# Altium integrated library ALTIUM-WE-LAN-rev17a.IntLib: 34 symbols
Pins are listed as number, name and electrical type; pins without a type are passive.

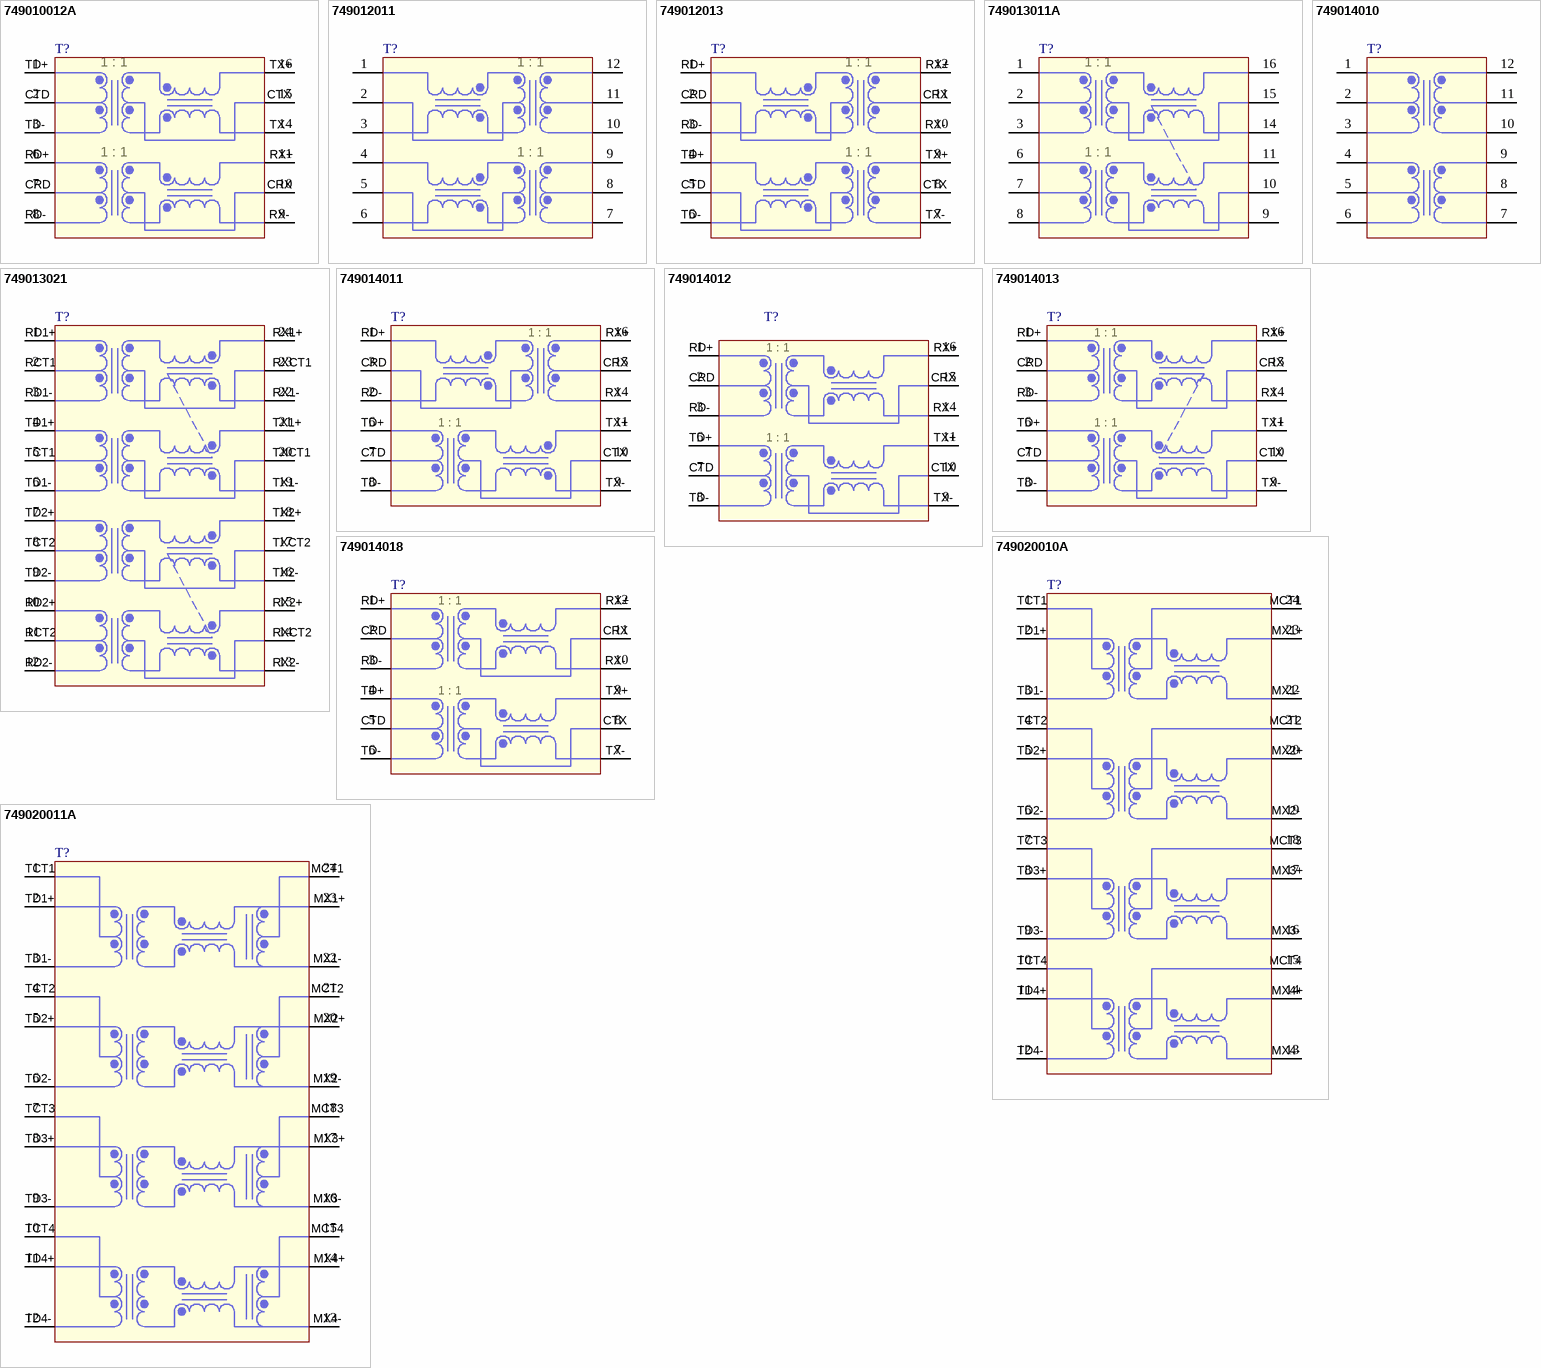
[diagram p0: symbols 749010012A to 749020011A]

## 749010012A
designator T?
WE-LAN LAN Transformer, 10/100 Base-T; PartNumber: 749010012A; PoE: non-PoE; PublishedDate: Dec. 2016; Publisher: Wurth Elektronik; ComponentLink1Description: Manufacturer; ComponentLink1URL: http://www.we-online.de; ComponentLink2Description: Datasheet; ComponentLink2URL: http://katalog.we-online.de/pbs/datasheet/749010012A.pdf; DataRate: 10/100 Base-T
footprint 749010012A (SMD LAN Transformers, body 12.7x8.8mm, 16-Leads)
pins: 1 TD+, 2 CTD, 3 TD-, 6 RD+, 7 CRD, 8 RD-, 9 RX-, 10 CRX, 11 RX+, 14 TX-, 15 CTX, 16 TX+
text: 1 : 1

## 749012011
designator T?
WE-LAN LAN Transformer, 10/100 Base-T; PartNumber: 749012011; PoE: PoE+ (over 350 mA); PublishedDate: Dec. 2016; Publisher: Wurth Elektronik; ComponentLink1Description: Manufacturer; ComponentLink1URL: http://www.we-online.de; ComponentLink2Description: Datasheet; ComponentLink2URL: http://katalog.we-online.de/pbs/datasheet/749012011.pdf; DataRate: 10/100 Base-T
footprint 749012011 (SMD LAN Transformers, body 17.1x14.75mm, 12-Leads)
pins: 1, 2, 3, 4, 5, 6, 7, 8, 9, 10, 11, 12
text: 1 : 1

## 749012013
designator T?
WE-LAN LAN Transformer, 10/100 Base-T; PartNumber: 749012013; PoE: PoE+ (over 350 mA); PublishedDate: Dec. 2016; Publisher: Wurth Elektronik; ComponentLink1Description: Manufacturer; ComponentLink1URL: http://www.we-online.de; ComponentLink2Description: Datasheet; ComponentLink2URL: http://katalog.we-online.de/pbs/datasheet/749012013.pdf; DataRate: 10/100 Base-T
footprint 749012013
pins: 1 RD+, 2 CRD, 3 RD-, 4 TD+, 5 CTD, 6 TD-, 7 TX-, 8 CTX, 9 TX+, 10 RX-, 11 CRX, 12 RX+
text: 1 : 1

## 749013011A
designator T?
WE-LAN LAN Transformer, 10/100 Base-T; PartNumber: 749013011A; PoE: PoE (up to 350 mA); PublishedDate: Dec. 2016; Publisher: Wurth Elektronik; ComponentLink1Description: Manufacturer; ComponentLink1URL: http://www.we-online.de; ComponentLink2Description: Datasheet; ComponentLink2URL: http://katalog.we-online.de/pbs/datasheet/749013011A.pdf; DataRate: 10/100 Base-T
footprint 749013011A
pins: 1, 2, 3, 6, 7, 8, 9, 10, 11, 14, 15, 16
text: 1 : 1

## 749013021
designator T?
WE-LAN LAN Transformer, 10/100 Base-T; PartNumber: 749013021; PoE: PoE (up to 350 mA); PublishedDate: Dec. 2016; Publisher: Wurth Elektronik; ComponentLink1Description: Manufacturer; ComponentLink1URL: http://www.we-online.de; ComponentLink2Description: Datasheet; ComponentLink2URL: http://katalog.we-online.de/pbs/datasheet/749013021.pdf; DataRate: 10/100 Base-T
footprint 749013021
pins: 1 RD1+, 2 RCT1, 3 RD1-, 4 TD1+, 5 TCT1, 6 TD1-, 7 TD2+, 8 TCT2, 9 TD2-, 10 RD2+, 11 RCT2, 12 RD2-, 13 RX2-, 14 RXCT2, 15 RX2+, 16 TX2-, 17 TXCT2, 18 TX2+, 19 TX1-, 20 TXCT1, 21 TX1+, 22 RX1-, 23 RXCT1, 24 RX1+

## 749014010
designator T?
WE-LAN LAN Transformer, 10/100 Base-T; PartNumber: 749014010; PoE: non-PoE; PublishedDate: Dec. 2016; Publisher: Wurth Elektronik; ComponentLink1Description: Manufacturer; ComponentLink1URL: http://www.we-online.de; ComponentLink2Description: Datasheet; ComponentLink2URL: http://katalog.we-online.de/pbs/datasheet/749014010.pdf; DataRate: 10/100 Base-T
footprint 749014010
pins: 1, 2, 3, 4, 5, 6, 7, 8, 9, 10, 11, 12

## 749014011
designator T?
WE-LAN LAN Transformer, 10/100 Base-T; PartNumber: 749014011; PoE: non-PoE; PublishedDate: Dec. 2016; Publisher: Wurth Elektronik; ComponentLink1Description: Manufacturer; ComponentLink1URL: http://www.we-online.de; ComponentLink2Description: Datasheet; ComponentLink2URL: http://katalog.we-online.de/pbs/datasheet/749014011.pdf; DataRate: 10/100 Base-T
footprint 749014011
pins: 1 RD+, 2 RD-, 3 CRD, 6 TD+, 7 CTD, 8 TD-, 9 TX-, 10 CTX, 11 TX+, 14 RX-, 15 CRX, 16 RX+
text: 1 : 1

## 749014012
designator T?
WE-LAN LAN Transformer, 10/100 Base-T; PartNumber: 749014012; PoE: non-PoE; PublishedDate: Dec. 2016; Publisher: Wurth Elektronik; ComponentLink1Description: Manufacturer; ComponentLink1URL: http://www.we-online.de; ComponentLink2Description: Datasheet; ComponentLink2URL: http://katalog.we-online.de/pbs/datasheet/749014012.pdf; DataRate: 10/100 Base-T
footprint 749014012
pins: 1 RD+, 2 CRD, 3 RD-, 6 TD+, 7 CTD, 8 TD-, 9 TX-, 10 CTX, 11 TX+, 14 RX-, 15 CRX, 16 RX+
text: 1 : 1

## 749014013
designator T?
WE-LAN LAN Transformer, 10/100 Base-T; PartNumber: 749014013; PoE: PoE (up to 350 mA); PublishedDate: Dec. 2016; Publisher: Wurth Elektronik; ComponentLink1Description: Manufacturer; ComponentLink1URL: http://www.we-online.de; ComponentLink2Description: Datasheet; ComponentLink2URL: http://katalog.we-online.de/pbs/datasheet/749014013.pdf; DataRate: 10/100 Base-T
footprint 749014013
pins: 1 RD+, 2 CRD, 3 RD-, 6 TD+, 7 CTD, 8 TD-, 9 TX-, 10 CTX, 11 TX+, 14 RX-, 15 CRX, 16 RX+
text: 1 : 1

## 749014018
designator T?
WE-LAN LAN Transformer, 10/100/1000 Base-T; PartNumber: 749014018; PoE: non-PoE; PublishedDate: Dec. 2016; Publisher: Wurth Elektronik; ComponentLink1Description: Manufacturer; ComponentLink1URL: http://www.we-online.de; ComponentLink2Description: Datasheet; ComponentLink2URL: http://katalog.we-online.de/pbs/datasheet/749014018.pdf; DataRate: 10/100/1000 Base-T
footprint 749014018
pins: 1 RD+, 2 CRD, 3 RD-, 4 TD+, 5 CTD, 6 TD-, 7 TX-, 8 CTX, 9 TX+, 10 RX-, 11 CRX, 12 RX+
text: 1 : 1

## 749020010A
designator T?
WE-LAN LAN Transformer, 10/100/1000 Base-T; PartNumber: 749020010A; PoE: non-PoE; PublishedDate: Dec. 2016; Publisher: Wurth Elektronik; ComponentLink1Description: Manufacturer; ComponentLink1URL: http://www.we-online.de; ComponentLink2Description: Datasheet; ComponentLink2URL: http://katalog.we-online.de/pbs/datasheet/749020010A.pdf; DataRate: 10/100/1000 Base-T
footprint 749020010A
pins: 1 TCT1, 2 TD1+, 3 TD1-, 4 TCT2, 5 TD2+, 6 TD2-, 7 TCT3, 8 TD3+, 9 TD3-, 10 TCT4, 11 TD4+, 12 TD4-, 13 MX4-, 14 MX4+, 15 MCT4, 16 MX3-, 17 MX3+, 18 MCT3, 19 MX2-, 20 MX2+, 21 MCT2, 22 MX1-, 23 MX1+, 24 MCT1

## 749020011A
designator T?
WE-LAN LAN Transformer, 10/100/1000 Base-T; PartNumber: 749020011A; PoE: non-PoE; PublishedDate: Dec. 2016; Publisher: Wurth Elektronik; ComponentLink1Description: Manufacturer; ComponentLink1URL: http://www.we-online.de; ComponentLink2Description: Datasheet; ComponentLink2URL: http://katalog.we-online.de/pbs/datasheet/749020011A.pdf; DataRate: 10/100/1000 Base-T
footprint 749020011A
pins: 1 TCT1, 2 TD1+, 3 TD1-, 4 TCT2, 5 TD2+, 6 TD2-, 7 TCT3, 8 TD3+, 9 TD3-, 10 TCT4, 11 TD4+, 12 TD4-, 13 MX4-, 14 MX4+, 15 MCT4, 16 MX3-, 17 MX3+, 18 MCT3, 19 MX2-, 20 MX2+, 21 MCT2, 22 MX1-, 23 MX1+, 24 MCT1

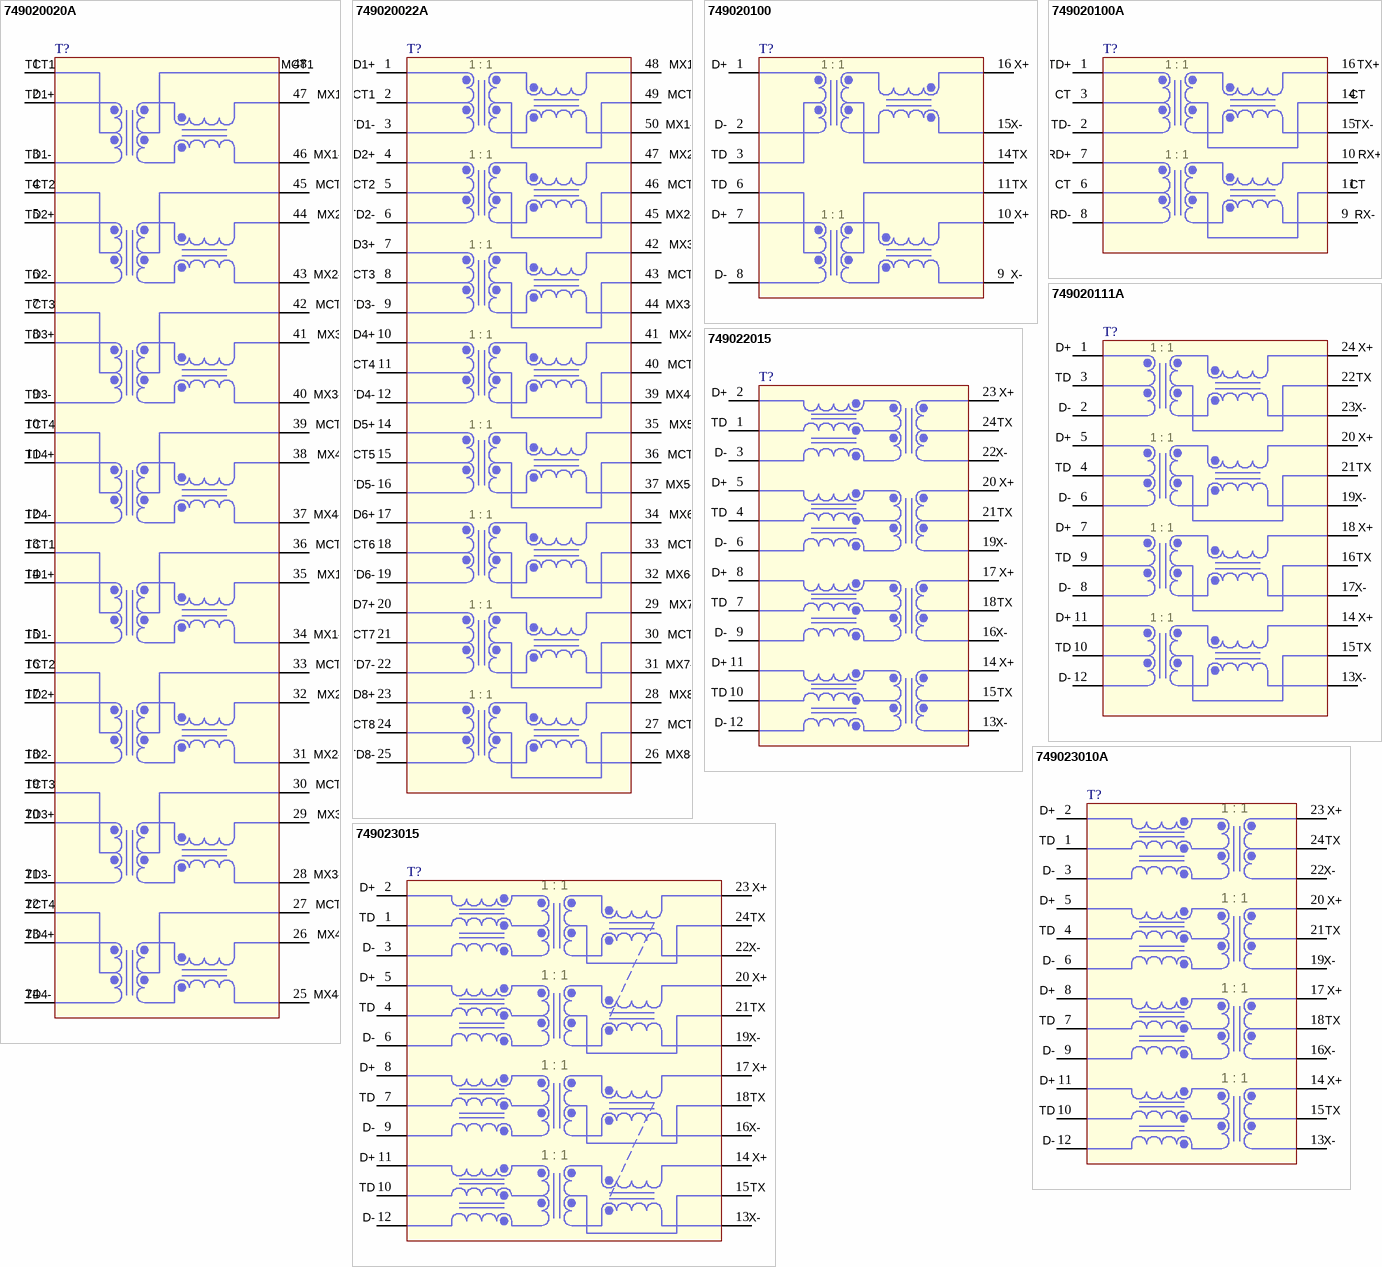
[diagram p1: symbols 749020020A to 749023015]

## 749020020A
designator T?
WE-LAN LAN Transformer, 10/100/1000 Base-T; PartNumber: 749020020A; PoE: non-PoE; PublishedDate: Dec. 2016; Publisher: Wurth Elektronik; ComponentLink1Description: Manufacturer; ComponentLink1URL: http://www.we-online.de; ComponentLink2Description: Datasheet; ComponentLink2URL: http://katalog.we-online.de/pbs/datasheet/749020020A.pdf; DataRate: 10/100/1000 Base-T
footprint 749020020A
pins: 1 TCT1, 2 TD1+, 3 TD1-, 4 TCT2, 5 TD2+, 6 TD2-, 7 TCT3, 8 TD3+, 9 TD3-, 10 TCT4, 11 TD4+, 12 TD4-, 13 TCT1, 14 TD1+, 15 TD1-, 16 TCT2, 17 TD2+, 18 TD2-, 19 TCT3, 20 TD3+, 21 TD3-, 22 TCT4, 23 TD4+, 24 TD4-, 25 MX4-, 26 MX4+, 27 MCT4, 28 MX3-, 29 MX3+, 30 MCT3, 31 MX2-, 32 MX2+, 33 MCT2, 34 MX1-, 35 MX1+, 36 MCT1, 37 MX4-, 38 MX4+, 39 MCT4, 40 MX3-, 41 MX3+, 42 MCT3, 43 MX2-, 44 MX2+, 45 MCT2, 46 MX1-, 47 MX1+, 48 MCT1

## 749020022A
designator T?
WE-LAN LAN Transformer, 10/100/1000 Base-T; PartNumber: 749020022A; PoE: non-PoE; PublishedDate: Dec. 2016; Publisher: Wurth Elektronik; ComponentLink1Description: Manufacturer; ComponentLink1URL: http://www.we-online.de; ComponentLink2Description: Datasheet; ComponentLink2URL: http://katalog.we-online.de/pbs/datasheet/749020022A.pdf; DataRate: 10/100/1000 Base-T
footprint 749020022A
pins: 1 TD1+, 2 TCT1, 3 TD1-, 4 TD2+, 5 TCT2, 6 TD2-, 7 TD3+, 8 TCT3, 9 TD3-, 10 TD4+, 11 TCT4, 12 TD4-, 14 TD5+, 15 TCT5, 16 TD5-, 17 TD6+, 18 TCT6, 19 TD6-, 20 TD7+, 21 TCT7, 22 TD7-, 23 TD8+, 24 TCT8, 25 TD8-, 26 MX8-, 27 MCT8, 28 MX8+, 29 MX7+, 30 MCT7, 31 MX7-, 32 MX6-, 33 MCT6, 34 MX6+, 35 MX5+, 36 MCT5, 37 MX5-, 39 MX4-, 40 MCT4, 41 MX4+, 42 MX3+, 43 MCT3, 44 MX3-, 45 MX2-, 46 MCT2, 47 MX2+, 48 MX1+, 49 MCT1, 50 MX1-
text: 1 : 1

## 749020100
designator T?
WE-LAN LAN Transformer, 10/100/1000 Base-T; PartNumber: 749020100; PoE: non-PoE; PublishedDate: Dec. 2016; Publisher: Wurth Elektronik; ComponentLink1Description: Manufacturer; ComponentLink1URL: http://www.we-online.de; ComponentLink2Description: Datasheet; ComponentLink2URL: http://katalog.we-online.de/pbs/datasheet/749020100.pdf; DataRate: 10/100/1000 Base-T
footprint 749020100
pins: 1 D+, 2 D-, 3 TD, 6 TD, 7 D+, 8 D-, 9 X-, 10 X+, 11 TX, 14 TX, 15 X-, 16 X+
text: 1 : 1

## 749020100A
designator T?
WE-LAN LAN Transformer, 10/100 Base-T; PartNumber: 749020100A; PoE: non-PoE; PublishedDate: Dec. 2016; Publisher: Wurth Elektronik; ComponentLink1Description: Manufacturer; ComponentLink1URL: http://www.we-online.de; ComponentLink2Description: Datasheet; ComponentLink2URL: http://katalog.we-online.de/pbs/datasheet/749020100A.pdf; DataRate: 10/100 Base-T
footprint 749020100A
pins: 1 TD+, 2 TD-, 3 CT, 6 CT, 7 RD+, 8 RD-, 9 RX-, 10 RX+, 11 CT, 14 CT, 15 TX-, 16 TX+
text: 1 : 1

## 749020111A
designator T?
WE-LAN LAN Transformer, 10/100/1000 Base-T; PartNumber: 749020111A; PoE: non-PoE; PublishedDate: Dec. 2016; Publisher: Wurth Elektronik; ComponentLink1Description: Manufacturer; ComponentLink1URL: http://www.we-online.de; ComponentLink2Description: Datasheet; ComponentLink2URL: http://katalog.we-online.de/pbs/datasheet/749020111A.pdf; DataRate: 10/100/1000 Base-T
footprint 749020111A
pins: 1 D+, 2 D-, 3 TD, 4 TD, 5 D+, 6 D-, 7 D+, 8 D-, 9 TD, 10 TD, 11 D+, 12 D-, 13 X-, 14 X+, 15 TX, 16 TX, 17 X-, 18 X+, 19 X-, 20 X+, 21 TX, 22 TX, 23 X-, 24 X+
text: 1 : 1

## 749022015
designator T?
WE-LAN LAN Transformer, 10/100/1000 Base-T; PartNumber: 749022015; PoE: PoE+ (over 350 mA); PublishedDate: Dec. 2016; Publisher: Wurth Elektronik; ComponentLink1Description: Manufacturer; ComponentLink1URL: http://www.we-online.de; ComponentLink2Description: Datasheet; ComponentLink2URL: http://katalog.we-online.de/pbs/datasheet/749022015.pdf; DataRate: 10/100/1000 Base-T
footprint 749022015
pins: 1 TD, 2 D+, 3 D-, 4 TD, 5 D+, 6 D-, 7 TD, 8 D+, 9 D-, 10 TD, 11 D+, 12 D-, 13 X-, 14 X+, 15 TX, 16 X-, 17 X+, 18 TX, 19 X-, 20 X+, 21 TX, 22 X-, 23 X+, 24 TX

## 749023010A
designator T?
WE-LAN LAN Transformer, 10/100/1000 Base-T; PartNumber: 749023010A; PoE: PoE (up to 350 mA); PublishedDate: Dec. 2016; Publisher: Wurth Elektronik; ComponentLink1Description: Manufacturer; ComponentLink1URL: http://www.we-online.de; ComponentLink2Description: Datasheet; ComponentLink2URL: http://katalog.we-online.de/pbs/datasheet/749023010A.pdf; DataRate: 10/100/1000 Base-T
footprint 749023010A
pins: 1 TD, 2 D+, 3 D-, 4 TD, 5 D+, 6 D-, 7 TD, 8 D+, 9 D-, 10 TD, 11 D+, 12 D-, 13 X-, 14 X+, 15 TX, 16 X-, 17 X+, 18 TX, 19 X-, 20 X+, 21 TX, 22 X-, 23 X+, 24 TX
text: 1 : 1

## 749023015
designator T?
WE-LAN LAN Transformer, 10/100/1000 Base-T; PartNumber: 749023015; PoE: PoE (up to 350 mA); PublishedDate: Dec. 2016; Publisher: Wurth Elektronik; ComponentLink1Description: Manufacturer; ComponentLink1URL: http://www.we-online.de; ComponentLink2Description: Datasheet; ComponentLink2URL: http://katalog.we-online.de/pbs/datasheet/749023015.pdf; DataRate: 10/100/1000 Base-T
footprint 749023015
pins: 1 TD, 2 D+, 3 D-, 4 TD, 5 D+, 6 D-, 7 TD, 8 D+, 9 D-, 10 TD, 11 D+, 12 D-, 13 X-, 14 X+, 15 TX, 16 X-, 17 X+, 18 TX, 19 X-, 20 X+, 21 TX, 22 X-, 23 X+, 24 TX
text: 1 : 1

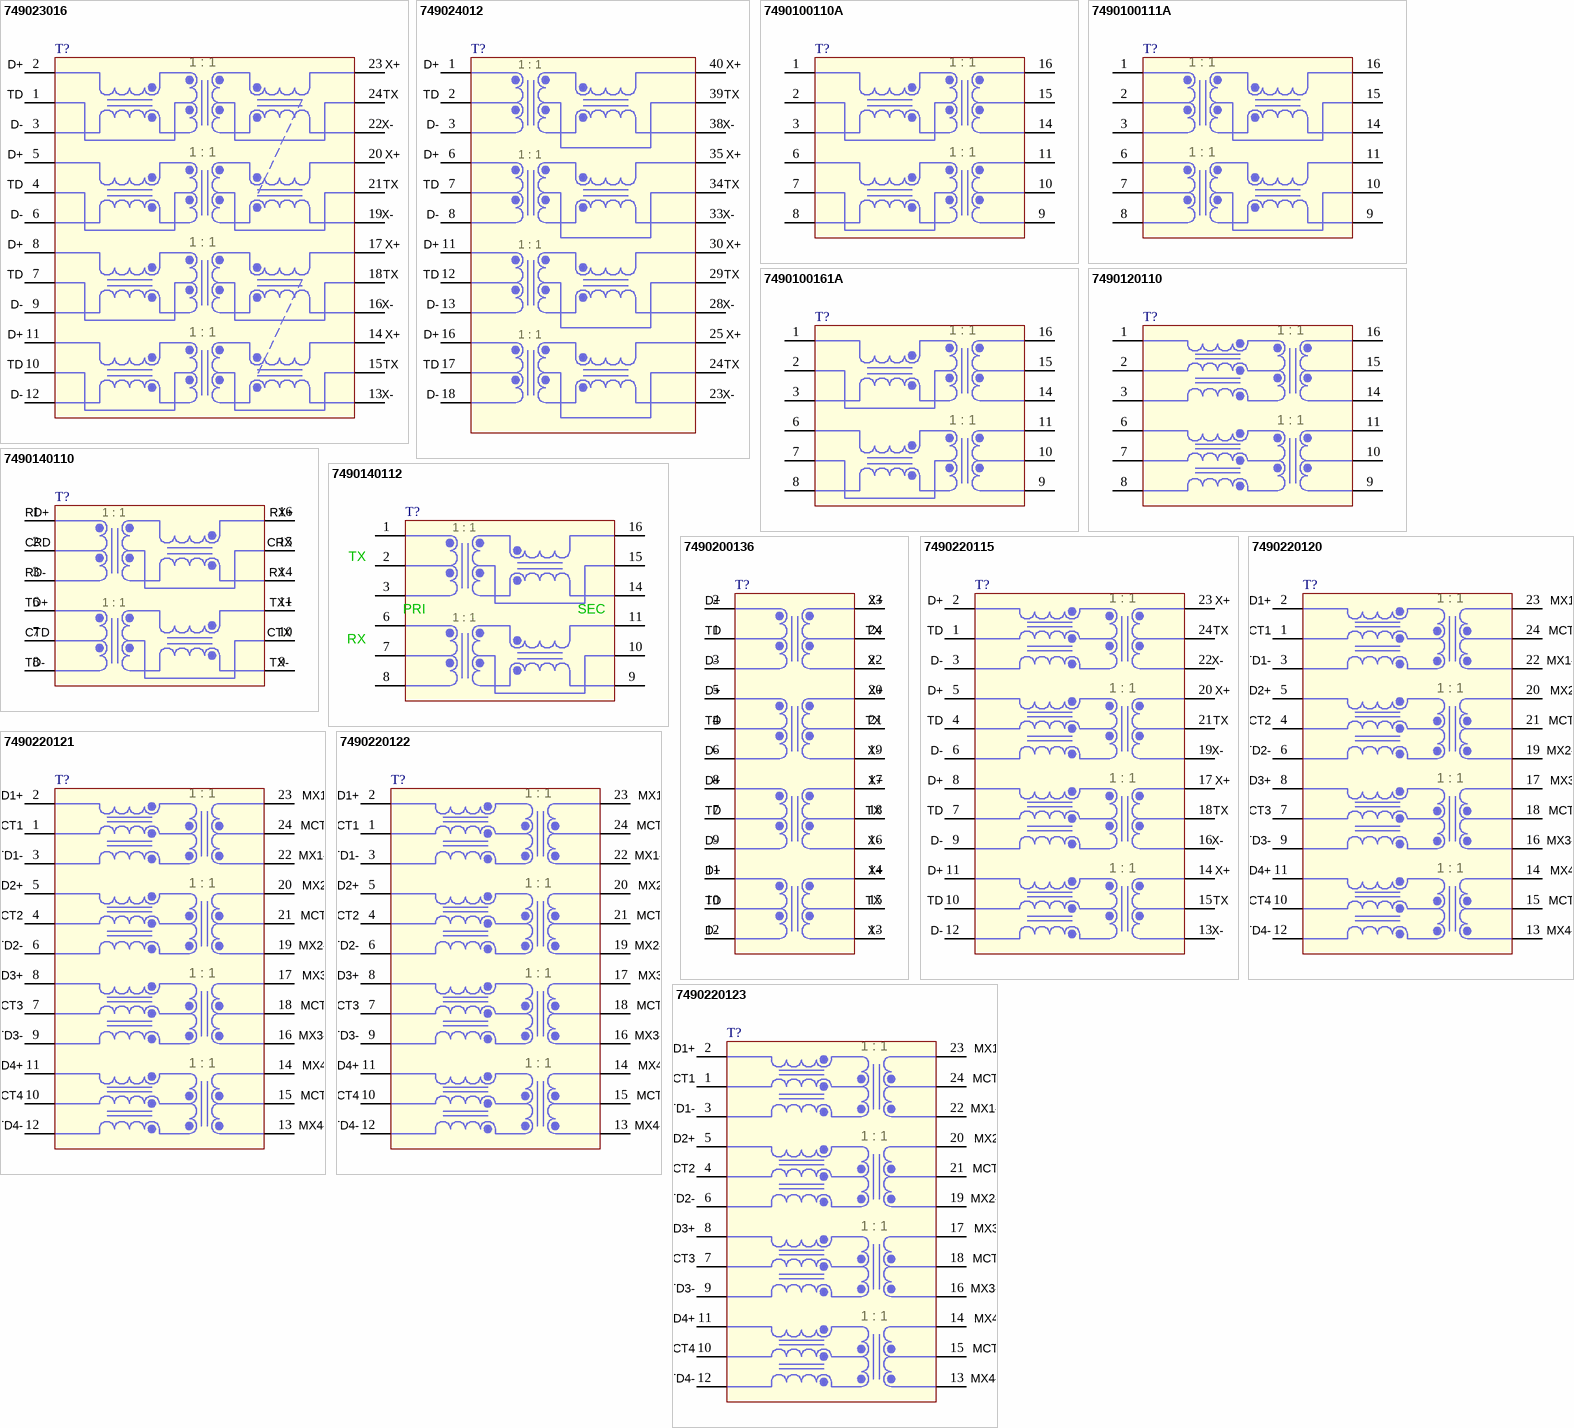
[diagram p2: symbols 749023016 to 7490220123]

## 749023016
designator T?
WE-LAN LAN Transformer, 10/100/1000 Base-T; PartNumber: 749023016; PoE: PoE (up to 350 mA); PublishedDate: Dec. 2016; Publisher: Wurth Elektronik; ComponentLink1Description: Manufacturer; ComponentLink1URL: http://www.we-online.de; ComponentLink2Description: Datasheet; ComponentLink2URL: http://katalog.we-online.de/pbs/datasheet/749023016.pdf; DataRate: 10/100/1000 Base-T
footprint 749023016
pins: 1 TD, 2 D+, 3 D-, 4 TD, 5 D+, 6 D-, 7 TD, 8 D+, 9 D-, 10 TD, 11 D+, 12 D-, 13 X-, 14 X+, 15 TX, 16 X-, 17 X+, 18 TX, 19 X-, 20 X+, 21 TX, 22 X-, 23 X+, 24 TX
text: 1 : 1

## 749024012
designator T?
WE-LAN LAN Transformer, 10/100/1000 Base-T; PartNumber: 749024012; PoE: non-PoE; PublishedDate: Dec. 2016; Publisher: Wurth Elektronik; ComponentLink1Description: Manufacturer; ComponentLink1URL: http://www.we-online.de; ComponentLink2Description: Datasheet; ComponentLink2URL: http://katalog.we-online.de/pbs/datasheet/749024012.pdf; DataRate: 10/100/1000 Base-T
footprint 749024012
pins: 1 D+, 2 TD, 3 D-, 6 D+, 7 TD, 8 D-, 11 D+, 12 TD, 13 D-, 16 D+, 17 TD, 18 D-, 23 X-, 24 TX, 25 X+, 28 X-, 29 TX, 30 X+, 33 X-, 34 TX, 35 X+, 38 X-, 39 TX, 40 X+
text: 1 : 1

## 7490100110A
designator T?
WE-LAN LAN Transformer, 10/100 Base-T; PartNumber: 7490100110A; PoE: non-PoE; PublishedDate: Dec. 2016; Publisher: Wurth Elektronik; ComponentLink1Description: Manufacturer; ComponentLink1URL: http://www.we-online.de; ComponentLink2Description: Datasheet; ComponentLink2URL: http://katalog.we-online.de/pbs/datasheet/7490100110A.pdf; DataRate: 10/100 Base-T
footprint 7490100110A (SMD LAN Transformers, body 12.7x8.8mm, 16-Leads)
pins: 1, 2, 3, 6, 7, 8, 9, 10, 11, 14, 15, 16
text: 1 : 1

## 7490100111A
designator T?
WE-LAN LAN Transformer, 10/100 Base-T; PartNumber: 7490100111A; PoE: non-PoE; PublishedDate: Dec. 2016; Publisher: Wurth Elektronik; ComponentLink1Description: Manufacturer; ComponentLink1URL: http://www.we-online.de; ComponentLink2Description: Datasheet; ComponentLink2URL: http://katalog.we-online.de/pbs/datasheet/7490100111A.pdf; DataRate: 10/100 Base-T
footprint 7490100111A (SMD LAN Transformers, body 12.7x8.8mm, 16-Leads)
pins: 1, 2, 3, 6, 7, 8, 9, 10, 11, 14, 15, 16
text: 1 : 1

## 7490100161A
designator T?
WE-LAN LAN Transformer, 10/100 Base-T; PartNumber: 7490100161A; PoE: non-PoE; PublishedDate: Dec. 2016; Publisher: Wurth Elektronik; ComponentLink1Description: Manufacturer; ComponentLink1URL: http://www.we-online.de; ComponentLink2Description: Datasheet; ComponentLink2URL: http://katalog.we-online.de/pbs/datasheet/7490100161A.pdf; DataRate: 10/100 Base-T
footprint 7490100161A
pins: 1, 2, 3, 6, 7, 8, 9, 10, 11, 14, 15, 16
text: 1 : 1

## 7490120110
designator T?
WE-LAN LAN Transformer, 10/100 Base-T; PartNumber: 7490120110; PoE: PoE+ (over 350 mA); PublishedDate: Dec. 2016; Publisher: Wurth Elektronik; ComponentLink1Description: Manufacturer; ComponentLink1URL: http://www.we-online.de; ComponentLink2Description: Datasheet; ComponentLink2URL: http://katalog.we-online.de/pbs/datasheet/7490120110.pdf; DataRate: 10/100 Base-T
footprint 7490120110
pins: 1, 2, 3, 6, 7, 8, 9, 10, 11, 14, 15, 16
text: 1 : 1

## 7490140110
designator T?
WE-LAN LAN Transformer, 10/100 Base-T; PartNumber: 7490140110; PoE: non-PoE; PublishedDate: Dec. 2016; Publisher: Wurth Elektronik; ComponentLink1Description: Manufacturer; ComponentLink1URL: http://www.we-online.de; ComponentLink2Description: Datasheet; ComponentLink2URL: http://katalog.we-online.de/pbs/datasheet/7490140110.pdf; DataRate: 10/100 Base-T
footprint 7490140110
pins: 1 RD+, 2 CRD, 3 RD-, 6 TD+, 7 CTD, 8 TD-, 9 TX-, 10 CTX, 11 TX+, 14 RX-, 15 CRX, 16 RX+
text: 1 : 1

## 7490140112
designator T?
WE-LAN LAN Transformer, 10/100 Base-T; PartNumber: 7490140112; PoE: non-PoE; PublishedDate: Dec. 2016; Publisher: Wurth Elektronik; ComponentLink1Description: Manufacturer; ComponentLink1URL: http://www.we-online.de; ComponentLink2Description: Datasheet; ComponentLink2URL: http://katalog.we-online.de/pbs/datasheet/7490140112.pdf; DataRate: 10/100 Base-T
footprint 7490140112
pins: 1, 2, 3, 6, 7, 8, 9, 10, 11, 14, 15, 16
text: 1 : 1; TX; PRI; SEC; RX

## 7490200136
designator T?
WE-LAN LAN Transformer, 10/100/1000 Base-T; PartNumber: 7490200136; PoE: non-PoE; PublishedDate: Dec. 2016; Publisher: Wurth Elektronik; ComponentLink1Description: Manufacturer; ComponentLink1URL: http://www.we-online.de; ComponentLink2Description: Datasheet; ComponentLink2URL: http://katalog.we-online.de/pbs/datasheet/7490200136.pdf; DataRate: 10/100/1000 Base-T
footprint 7490200136
pins: 1 TD, 2 D+, 3 D-, 4 TD, 5 D+, 6 D-, 7 TD, 8 D+, 9 D-, 10 TD, 11 D+, 12 D-, 13 X-, 14 X+, 15 TX, 16 X-, 17 X+, 18 TX, 19 X-, 20 X+, 21 TX, 22 X-, 23 X+, 24 TX

## 7490220115
designator T?
WE-LAN LAN Transformer, 10/100/1000 Base-T; PartNumber: 7490220115; PoE: 4PPoE (to 800 mA); PublishedDate: Dec. 2016; Publisher: Wurth Elektronik; ComponentLink1Description: Manufacturer; ComponentLink1URL: http://www.we-online.de; ComponentLink2Description: Datasheet; ComponentLink2URL: http://katalog.we-online.de/pbs/datasheet/7490220115.pdf; DataRate: 10/100/1000 Base-T
footprint 7490220115
pins: 1 TD, 2 D+, 3 D-, 4 TD, 5 D+, 6 D-, 7 TD, 8 D+, 9 D-, 10 TD, 11 D+, 12 D-, 13 X-, 14 X+, 15 TX, 16 X-, 17 X+, 18 TX, 19 X-, 20 X+, 21 TX, 22 X-, 23 X+, 24 TX
text: 1 : 1

## 7490220120
designator T?
WE-LAN LAN Transformer, 10/100/1000 Base-T; PartNumber: 7490220120; PoE: 4PPoE (to 350 mA); PublishedDate: Dec. 2016; Publisher: Wurth Elektronik; ComponentLink1Description: Manufacturer; ComponentLink1URL: http://www.we-online.de; ComponentLink2Description: Datasheet; ComponentLink2URL: http://katalog.we-online.de/pbs/datasheet/7490220120.pdf; DataRate: 10/100/1000 Base-T
footprint 7490220120
pins: 1 TCT1, 2 TD1+, 3 TD1-, 4 TCT2, 5 TD2+, 6 TD2-, 7 TCT3, 8 TD3+, 9 TD3-, 10 TCT4, 11 TD4+, 12 TD4-, 13 MX4-, 14 MX4+, 15 MCT4, 16 MX3-, 17 MX3+, 18 MCT3, 19 MX2-, 20 MX2+, 21 MCT2, 22 MX1-, 23 MX1+, 24 MCT1
text: 1 : 1

## 7490220121
designator T?
WE-LAN LAN Transformer, 10/100/1000 Base-T; PartNumber: 7490220121; PoE: 4PPoE (to 600 mA); PublishedDate: Dec. 2016; Publisher: Wurth Elektronik; ComponentLink1Description: Manufacturer; ComponentLink1URL: http://www.we-online.de; ComponentLink2Description: Datasheet; ComponentLink2URL: http://katalog.we-online.de/pbs/datasheet/7490220121.pdf; DataRate: 10/100/1000 Base-T
footprint 7490220121
pins: 1 TCT1, 2 TD1+, 3 TD1-, 4 TCT2, 5 TD2+, 6 TD2-, 7 TCT3, 8 TD3+, 9 TD3-, 10 TCT4, 11 TD4+, 12 TD4-, 13 MX4-, 14 MX4+, 15 MCT4, 16 MX3-, 17 MX3+, 18 MCT3, 19 MX2-, 20 MX2+, 21 MCT2, 22 MX1-, 23 MX1+, 24 MCT1
text: 1 : 1

## 7490220122
designator T?
WE-LAN LAN Transformer, 10/100/1000 Base-T; PartNumber: 7490220122; PoE: 4PPoE (to 900 mA); PublishedDate: Dec. 2016; Publisher: Wurth Elektronik; ComponentLink1Description: Manufacturer; ComponentLink1URL: http://www.we-online.de; ComponentLink2Description: Datasheet; ComponentLink2URL: http://katalog.we-online.de/pbs/datasheet/7490220122.pdf; DataRate: 10/100/1000 Base-T
footprint 7490220122
pins: 1 TCT1, 2 TD1+, 3 TD1-, 4 TCT2, 5 TD2+, 6 TD2-, 7 TCT3, 8 TD3+, 9 TD3-, 10 TCT4, 11 TD4+, 12 TD4-, 13 MX4-, 14 MX4+, 15 MCT4, 16 MX3-, 17 MX3+, 18 MCT3, 19 MX2-, 20 MX2+, 21 MCT2, 22 MX1-, 23 MX1+, 24 MCT1
text: 1 : 1

## 7490220123
designator T?
WE-LAN LAN Transformer, 10/100/1000 Base-T; PartNumber: 7490220123; PoE: 4PPoE (to 1400 mA); PublishedDate: Dec. 2016; Publisher: Wurth Elektronik; ComponentLink1Description: Manufacturer; ComponentLink1URL: http://www.we-online.de; ComponentLink2Description: Datasheet; ComponentLink2URL: http://katalog.we-online.de/pbs/datasheet/7490220123.pdf; DataRate: 10/100/1000 Base-T
footprint 7490220123
pins: 1 TCT1, 2 TD1+, 3 TD1-, 4 TCT2, 5 TD2+, 6 TD2-, 7 TCT3, 8 TD3+, 9 TD3-, 10 TCT4, 11 TD4+, 12 TD4-, 13 MX4-, 14 MX4+, 15 MCT4, 16 MX3-, 17 MX3+, 18 MCT3, 19 MX2-, 20 MX2+, 21 MCT2, 22 MX1-, 23 MX1+, 24 MCT1
text: 1 : 1